# Altium footprint library IC.PcbLib: 44 footprints (part 2 of 3)
Each footprint in its own frame and in the unit in brackets; x right, y up, seen from the top. Pads: shape width x height; smd on the part's side, far side on the other; paste and mask are expansions set on the pad; w line width, h text height; cw(c..) or ccw(c..) is an arc to the next point about the centre after c.
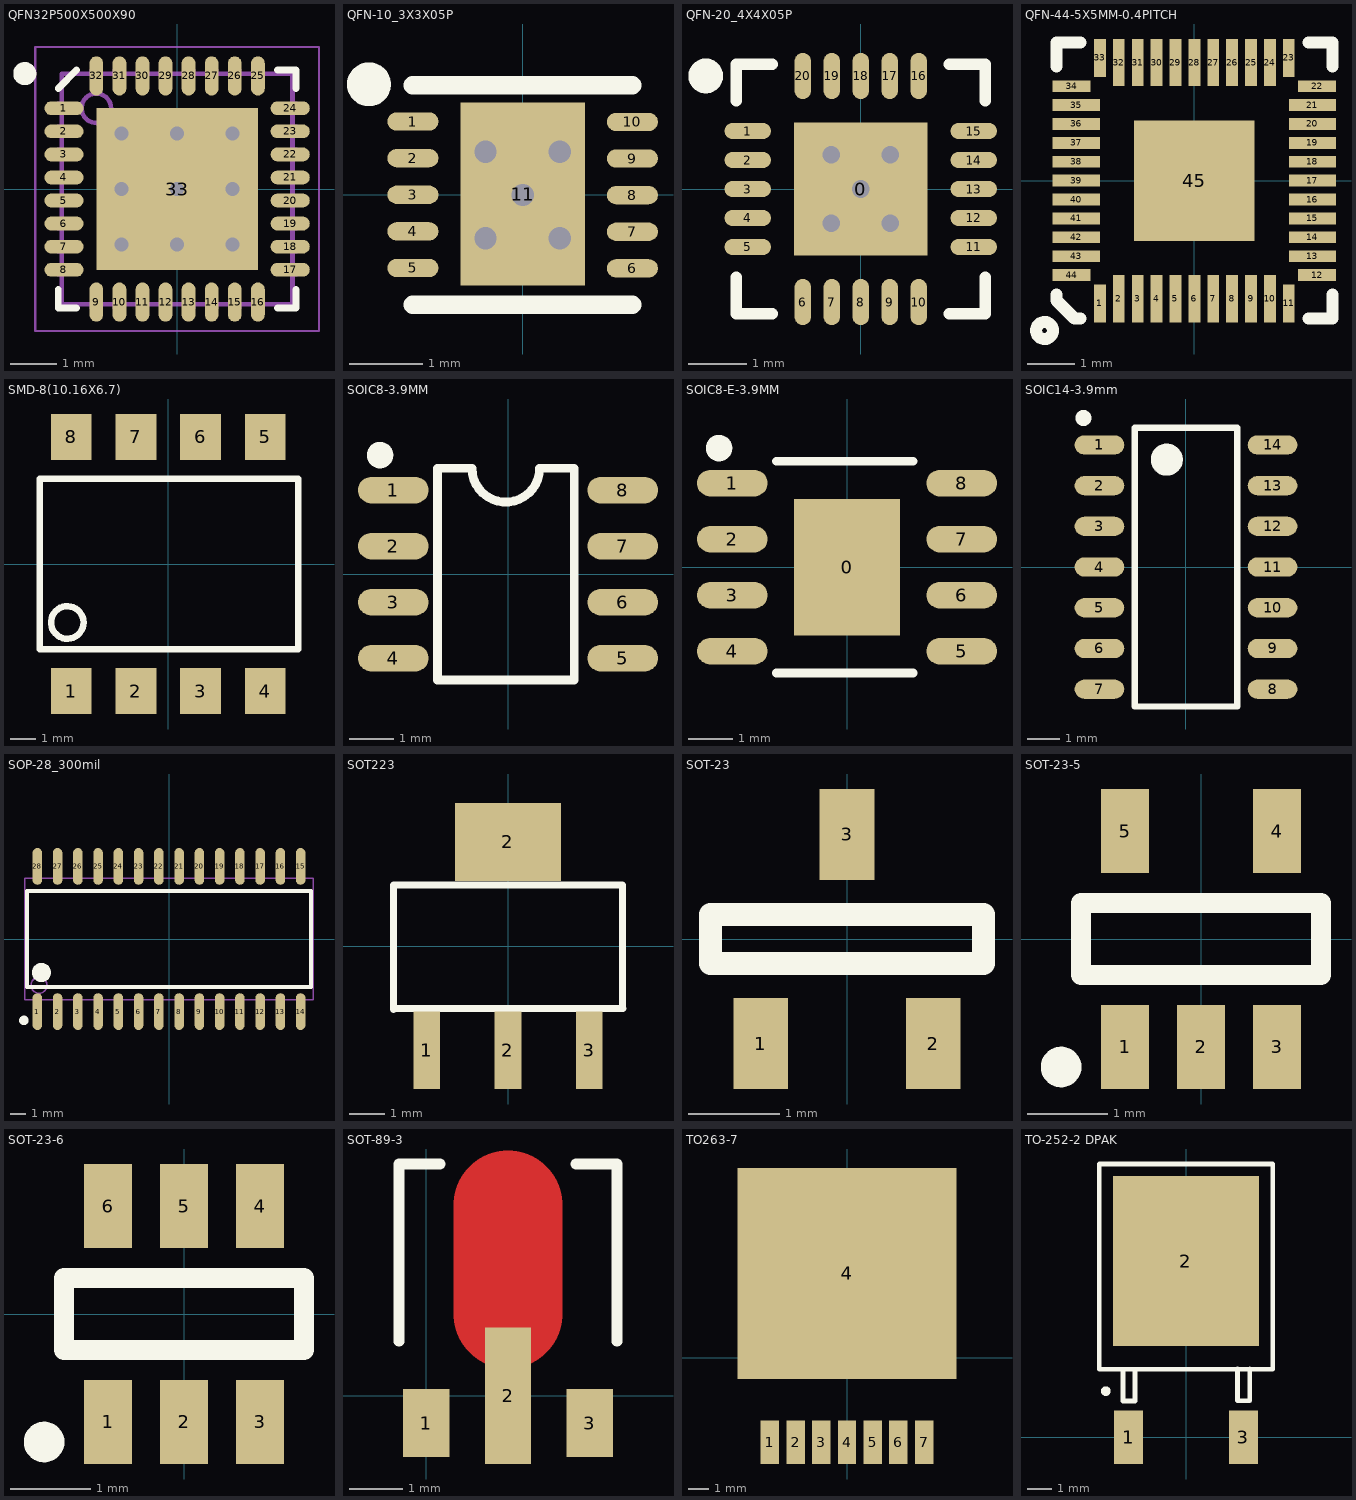
[diagram p1: the footprints below, top view; thin cyan lines are the x and y axes]

## QFN32P500X500X90 [mm] "nrf52810qcaa"
pads (33):
  oval 0.85x0.3 smd mask+0.076: 1(-2.45,1.75) 2(-2.45,1.25) 3(-2.45,0.75) 4(-2.45,0.25) 5(-2.45,-0.25) 6(-2.45,-0.75) 7(-2.45,-1.25) 8(-2.45,-1.75) 17(2.45,-1.75) 18(2.45,-1.25) 19(2.45,-0.75) 20(2.45,-0.25) 21(2.45,0.25) 22(2.45,0.75) 23(2.45,1.25) 24(2.45,1.75)
  oval 0.3x0.85 smd mask+0.076: 9(-1.75,-2.45) 10(-1.25,-2.45) 11(-0.75,-2.45) 12(-0.25,-2.45) 13(0.25,-2.45) 14(0.75,-2.45) 15(1.25,-2.45) 16(1.75,-2.45) 25(1.75,2.45) 26(1.25,2.45) 27(0.75,2.45) 28(0.25,2.45) 29(-0.25,2.45) 30(-0.75,2.45) 31(-1.25,2.45) 32(-1.75,2.45)
  rect 3.5x3.5 smd: 33(0,0)
via 0,0 diameter 0.61 hole 0.305
via 0,1.2 diameter 0.61 hole 0.305
via -1.2,1.2 diameter 0.61 hole 0.305
via -1.2,0 diameter 0.61 hole 0.305
via -1.2,-1.2 diameter 0.61 hole 0.305
via 0,-1.2 diameter 0.61 hole 0.305
via 1.2,-1.2 diameter 0.61 hole 0.305
via 1.2,0 diameter 0.61 hole 0.305
via 1.2,1.2 diameter 0.61 hole 0.305
Top Overlay:
  circle w0.25: c-3.3,2.5 r0.125
  lines w0.15: -2.575,-2.175 -2.575,-2.575 -2.175,-2.575 ; -2.575,2.175 -2.175,2.575 ; 2.175,-2.575 2.575,-2.575 2.575,-2.175 ; 2.175,2.575 2.575,2.575 2.575,2.175
Mechanical 7:
  circle w0.1: c-1.75,1.75 r0.32
  lines w0.1: -2.5,-1.845 -2.571,-1.845 cw(c-2.571,-1.75) -2.571,-1.655 -2.5,-1.655 ; -2.5,-1.345 -2.571,-1.345 cw(c-2.571,-1.25) -2.571,-1.155 -2.5,-1.155 ; -2.5,-0.845 -2.571,-0.845 cw(c-2.571,-0.75) -2.571,-0.655 -2.5,-0.655 ; -2.5,-0.345 -2.571,-0.345 cw(c-2.571,-0.25) -2.571,-0.155 -2.5,-0.155 ; -2.5,0.155 -2.571,0.155 cw(c-2.571,0.25) -2.571,0.345 -2.5,0.345 ; -2.5,0.655 -2.571,0.655 cw(c-2.571,0.75) -2.571,0.845 -2.5,0.845 ; -2.5,1.155 -2.571,1.155 cw(c-2.571,1.25) -2.571,1.345 -2.5,1.345 ; -2.5,1.655 -2.571,1.655 cw(c-2.571,1.75) -2.571,1.845 -2.5,1.845 ; -1.845,-2.5 -1.845,-2.571 ccw(c-1.75,-2.571) -1.655,-2.571 -1.655,-2.5 ; -1.845,2.5 -1.845,2.571 cw(c-1.75,2.571) -1.655,2.571 -1.655,2.5 ; -1.345,-2.5 -1.345,-2.571 ccw(c-1.25,-2.571) -1.155,-2.571 -1.155,-2.5 ; -1.345,2.5 -1.345,2.571 cw(c-1.25,2.571) -1.155,2.571 -1.155,2.5 ; -0.845,-2.5 -0.845,-2.571 ccw(c-0.75,-2.571) -0.655,-2.571 -0.655,-2.5 ; -0.845,2.5 -0.845,2.571 cw(c-0.75,2.571) -0.655,2.571 -0.655,2.5 ; -0.345,-2.5 -0.345,-2.571 ccw(c-0.25,-2.571) -0.155,-2.571 -0.155,-2.5 ; -0.345,2.5 -0.345,2.571 cw(c-0.25,2.571) -0.155,2.571 -0.155,2.5 ; 0.155,-2.5 0.155,-2.571 ccw(c0.25,-2.571) 0.345,-2.571 0.345,-2.5 ; 0.155,2.5 0.155,2.571 cw(c0.25,2.571) 0.345,2.571 0.345,2.5 ; 0.655,-2.5 0.655,-2.571 ccw(c0.75,-2.571) 0.845,-2.571 0.845,-2.5 ; 0.655,2.5 0.655,2.571 cw(c0.75,2.571) 0.845,2.571 0.845,2.5 ; 1.155,-2.5 1.155,-2.571 ccw(c1.25,-2.571) 1.345,-2.571 1.345,-2.5 ; 1.155,2.5 1.155,2.571 cw(c1.25,2.571) 1.345,2.571 1.345,2.5 ; 1.655,-2.5 1.655,-2.571 ccw(c1.75,-2.571) 1.845,-2.571 1.845,-2.5 ; 1.655,2.5 1.655,2.571 cw(c1.75,2.571) 1.845,2.571 1.845,2.5 ; 2.5,-1.845 2.571,-1.845 ccw(c2.571,-1.75) 2.571,-1.655 2.5,-1.655 ; 2.5,-1.345 2.571,-1.345 ccw(c2.571,-1.25) 2.571,-1.155 2.5,-1.155 ; 2.5,-0.845 2.571,-0.845 ccw(c2.571,-0.75) 2.571,-0.655 2.5,-0.655 ; 2.5,-0.345 2.571,-0.345 ccw(c2.571,-0.25) 2.571,-0.155 2.5,-0.155 ; 2.5,0.155 2.571,0.155 ccw(c2.571,0.25) 2.571,0.345 2.5,0.345 ; 2.5,0.655 2.571,0.655 ccw(c2.571,0.75) 2.571,0.845 2.5,0.845 ; 2.5,1.155 2.571,1.155 ccw(c2.571,1.25) 2.571,1.345 2.5,1.345 ; 2.5,1.655 2.571,1.655 ccw(c2.571,1.75) 2.571,1.845 2.5,1.845 ; -2.5,-2.5 -2.5,2.5 2.5,2.5 2.5,-2.5 -2.5,-2.5
Mechanical 15:
  lines w0.05: -3.075,-3.075 3.075,-3.075 3.075,3.075 -3.075,3.075 -3.075,-3.075
  lines w0.1: -0.5,0 0.5,0 ; 0,-0.5 0,0.5
3D body "QFN50P500X500X90_HS-33N.step": height 0.9, standoff 0, extent -2.501,-2.501 2.501,2.501

## QFN-10_3X3X05P [mm]
pads (11):
  oval 0.7x0.25 smd: 1(-1.5,1.003) 2(-1.5,0.503) 3(-1.5,0.003) 4(-1.5,-0.498) 5(-1.5,-0.998) 6(1.5,-1.003) 7(1.5,-0.503) 8(1.5,-0.003) 9(1.5,0.498) 10(1.5,0.998)
  rect 1.7x2.5 smd: 11(0,0.013)
via 0.508,0.59 diameter 0.61 hole 0.305
via 0.508,-0.59 diameter 0.61 hole 0.305
via 0,0 diameter 0.61 hole 0.305
via -0.508,-0.59 diameter 0.61 hole 0.305
via -0.508,0.59 diameter 0.61 hole 0.305
Top Overlay:
  lines w0.254: -1.5,-1.5 1.5,-1.5 ; -1.5,1.5 1.5,1.5
  lines w0.3: -1.951,1.511 cw(c-2.101,1.513) -1.951,1.514

## QFN-20_4X4X05P [mm]
pads (21):
  rect 2.3x2.3 smd: 0(0,0)
  oval 0.8x0.28 smd: 1(-1.95,1) 2(-1.95,0.5) 3(-1.95,0) 4(-1.95,-0.5) 5(-1.95,-1) 11(1.95,-1) 12(1.95,-0.5) 13(1.95,0) 14(1.95,0.5) 15(1.95,1)
  oval 0.28x0.8 smd: 6(-1,-1.95) 7(-0.5,-1.95) 8(0,-1.95) 9(0.5,-1.95) 10(1,-1.95) 16(1,1.95) 17(0.5,1.95) 18(0,1.95) 19(-0.5,1.95) 20(-1,1.95)
via 0.508,0.59 diameter 0.61 hole 0.305
via 0.508,-0.59 diameter 0.61 hole 0.305
via 0,0 diameter 0.61 hole 0.305
via -0.508,-0.59 diameter 0.61 hole 0.305
via -0.508,0.59 diameter 0.61 hole 0.305
Top Overlay:
  lines w0.2: -2.15,-1.525 -2.15,-2.15 -1.525,-2.15 ; -2.15,1.525 -2.15,2.15 -1.525,2.15 ; 1.525,-2.15 2.15,-2.15 2.15,-1.525 ; 1.525,2.15 2.15,2.15 2.15,1.525
  lines w0.3: -2.525,1.948 cw(c-2.675,1.949) -2.525,1.951

## QFN-44-5X5MM-0.4PITCH [mm]
pads (45):
  rect 0.25x0.8 smd: 1(-2,-2.6) 11(2,-2.6) 23(2,2.6) 33(-2,2.6)
  rect 0.25x1 smd: 2(-1.6,-2.5) 3(-1.2,-2.5) 4(-0.8,-2.5) 5(-0.4,-2.5) 6(0,-2.5) 7(0.4,-2.5) 8(0.8,-2.5) 9(1.2,-2.5) 10(1.6,-2.5) 24(1.6,2.5) 25(1.2,2.5) 26(0.8,2.5) 27(0.4,2.5) 28(0,2.5) 29(-0.4,2.5) 30(-0.8,2.5) 31(-1.2,2.5) 32(-1.6,2.5)
  rect 0.8x0.25 smd: 12(2.6,-2) 22(2.6,2) 34(-2.6,2) 44(-2.6,-2)
  rect 1x0.25 smd: 13(2.5,-1.6) 14(2.5,-1.2) 15(2.5,-0.8) 16(2.5,-0.4) 17(2.5,0) 18(2.5,0.4) 19(2.5,0.8) 20(2.5,1.2) 21(2.5,1.6) 35(-2.5,1.6) 36(-2.5,1.2) 37(-2.5,0.8) 38(-2.5,0.4) 39(-2.5,0) 40(-2.5,-0.4) 41(-2.5,-0.8) 42(-2.5,-1.2) 43(-2.5,-1.6)
  rect 2.55x2.55 smd: 45(0,0)
Top Overlay:
  circle w0.254: c-3.175,-3.175 r0.18
  lines w0.254: -2.921,-2.413 -2.921,-2.54 -2.54,-2.921 -2.413,-2.921 ; -2.921,2.413 -2.921,2.921 -2.413,2.921 ; 2.413,-2.921 2.921,-2.921 2.921,-2.413 ; 2.413,2.921 2.921,2.921 2.921,2.413

## SMD-8(10.16X6.7) [mm]
pads (8):
  rect 1.6x1.8 smd: 1(-3.81,-5) 2(-1.27,-5) 3(1.27,-5) 4(3.81,-5) 5(3.81,5) 6(1.27,5) 7(-1.27,5) 8(-3.81,5)
Top Overlay:
  circle w0.254: c-3.97,-2.3 r0.64
  lines w0.254: -5.05,-3.35 5.11,-3.35 5.11,3.35 -5.05,3.35 -5.05,-3.35

## SOIC8-3.9MM [mm]
pads (8):
  oval 1.6x0.6 smd: 1(-2.6,1.905) 2(-2.6,0.635) 3(-2.6,-0.635) 4(-2.6,-1.905) 5(2.6,-1.905) 6(2.6,-0.635) 7(2.6,0.635) 8(2.6,1.905)
Top Overlay:
  circle w0.3: c-2.9,2.7 r0.15
  lines w0.2: -1.6,-2.4 -1.6,2.4 -0.817,2.4 ccw(c-0.05,2.4) 0.717,2.4 1.5,2.4 1.5,-2.4 -1.6,-2.4
3D body "User Library-SOIC-8 - TEK.step": height 1.6, standoff -0.15, extent -3,-2.5 3,2.5

## SOIC8-E-3.9MM [mm]
pads (9):
  rect 2.4x3.1 smd: 0(0,0)
  oval 1.6x0.6 smd: 1(-2.6,1.905) 2(-2.6,0.635) 3(-2.6,-0.635) 4(-2.6,-1.905) 5(2.6,-1.905) 6(2.6,-0.635) 7(2.6,0.635) 8(2.6,1.905)
Top Overlay:
  circle w0.3: c-2.9,2.7 r0.15
  lines w0.2: -1.6,-2.4 1.5,-2.4 ; -1.6,2.4 1.5,2.4
3D body "User Library-SOIC-8 - TEK.step": height 1.6, standoff -0.15, extent -3,-2.5 3,2.5

## SOIC14-3.9mm [mm] "SOIC14 39mm"
pads (14):
  oval 1.55x0.6 smd: 1(-2.7,3.81) 2(-2.7,2.54) 3(-2.7,1.27) 4(-2.7,0) 5(-2.7,-1.27) 6(-2.7,-2.54) 7(-2.7,-3.81) 8(2.7,-3.81) 9(2.7,-2.54) 10(2.7,-1.27) 11(2.7,0) 12(2.7,1.27) 13(2.7,2.54) 14(2.7,3.81)
Top Overlay:
  circle w0.5: c-0.6,3.35 r0.25
  circle w0.25: c-3.2,4.65 r0.125
  lines w0.2: -1.6,-4.35 1.6,-4.35 1.6,4.35 -1.6,4.35 -1.6,-4.35
3D body "User Library-SOIC-14.step": height 1.75, standoff 0, extent -3,-4.375 3,4.375

## SOP-28_300mil [mm]
pads (28):
  oval 0.6x2.3 smd: 1(-8.255,-4.55) 2(-6.985,-4.55) 3(-5.715,-4.55) 4(-4.445,-4.55) 5(-3.175,-4.55) 6(-1.905,-4.55) 7(-0.635,-4.55) 8(0.635,-4.55) 9(1.905,-4.55) 10(3.175,-4.55) 11(4.445,-4.55) 12(5.715,-4.55) 13(6.985,-4.55) 14(8.255,-4.55) 15(8.255,4.55) 16(6.985,4.55) 17(5.715,4.55) 18(4.445,4.55) 19(3.175,4.55) 20(1.905,4.55) 21(0.635,4.55) 22(-0.635,4.55) 23(-1.905,4.55) 24(-3.175,4.55) 25(-4.445,4.55) 26(-5.715,4.55) 27(-6.985,4.55) 28(-8.255,4.55)
Top Overlay:
  circle w0.6: c-8,-2.1 r0.3
  circle w0.3: c-9.1,-5.1 r0.15
  lines w0.254: -8.9,-3 8.9,-3 8.9,3 -8.9,3 -8.9,-3
Mechanical 13:
  circle w0.1: c-8.15,-2.9 r0.5
  lines w0.1: -9.05,-3.8 9.05,-3.8 9.05,3.8 -9.05,3.8 -9.05,-3.8
3D body: height 2.5, standoff 0.3, extent -9.05,-3.8 9.05,3.8

## SOT223 [mm]
height 50
pads (4):
  rect 0.76x2.2 smd: 1(-2.3,-2.95) 2(0,-2.95) 3(2.3,-2.95)
  rect 3x2.2 smd: 2(0,2.95)
Top Overlay:
  lines w0.2: -3.25,-1.795 -3.23,-1.775 ; 3.25,-1.765 3.26,-1.775 ; -3.25,-1.775 3.25,-1.775 3.25,1.725 -3.25,1.725 -3.25,-1.775
3D body "User Library-SOT-223-1.step": height 1.69, standoff 0.04, extent -3.25,-3.5 3.25,3.5

## SOT-23 [mm] "SOT-23-3"
height 1.1
pads (3):
  rect 0.6x1 smd: 1(-0.95,-1.15) 2(0.95,-1.15) 3(0,1.15)
Top Overlay:
  lines w0.254: -1.5,-0.27 -1.5,0.27 1.5,0.27 1.5,-0.27 -1.5,-0.27
3D body "SOT-23-3.STEP": height 0.99, standoff 0.01, extent -1.46,-1.275 1.46,1.273

## SOT-23-5 [mm] "SOT-23-5"
height 1.2
pads (5):
  rect 0.6x1.05 smd: 1(-0.95,-1.35) 2(0,-1.35) 3(0.95,-1.35) 4(0.95,1.35) 5(-0.95,1.35)
Top Overlay:
  circle w0.254: c-1.75,-1.6 r0.127
  lines w0.254: -1.5,-0.45 1.5,-0.45 1.5,0.45 -1.5,0.45 -1.5,-0.45
3D body "SOT-23-5.STEP": height 1.3, standoff 0, extent -1.5,-1.5 1.5,1.5

## SOT-23-6 [mm] "SOT-23-6"
height 1.2
pads (6):
  rect 0.6x1.05 smd: 1(-0.95,-1.35) 2(0,-1.35) 3(0.95,-1.35) 4(0.95,1.35) 5(0,1.35) 6(-0.95,1.35)
Top Overlay:
  circle w0.254: c-1.75,-1.6 r0.127
  lines w0.254: -1.5,-0.45 1.5,-0.45 1.5,0.45 -1.5,0.45 -1.5,-0.45
3D body "SOT-23-6.STEP": height 1.3, standoff 0, extent -1.5,-1.5 1.5,1.5

## SOT-89-3 [mil]
pads (3):
  rect 34x50 smd: 1(0,-20) 3(120,-20)
  rect 34x100 smd: 2(60,0)
Top Layer:
  lines w80: 60,60 60,140
Top Overlay:
  lines w8: -20,40 -20,170 10,170 ; 110,170 140,170 140,40
Top Solder:
  lines w80: 60,60 60,140
3D body "User Library-SOT-89-2.STEP": height 55.12, standoff 0, extent -30,-30 147.17,124.92

## TO263-7 [mil]
pads (8):
  rect 35.8x85 smd: 1(-150,-164) 2(-100,-164) 3(-50,-164) 4(0,-164) 5(50,-164) 6(100,-164) 7(150,-164)
  rect 425.2x409.8 smd: 4(0,164)
Top Overlay:
  lines w10: -198,-27 198,-27 ; -198,314 198,314
Mechanical 15:
  lines w10: -198,314 -198,-27 198,-27 198,314

## TO-252-2 DPAK [mm]
pads (3):
  rect 1.2x2.2 smd: 1(-2.361,0) 3(2.361,0.004)
  rect 6x7 smd: 2(0,7.25)
Top Overlay:
  circle w0.2: c-3.3,1.9 r0.1
  lines w0.2: -2.6,2.8 -2.6,1.5 -2.1,1.5 -2.1,2.8 ; 2.123,2.804 2.123,1.504 2.623,1.504 2.623,2.804 ; -3.573,2.8 3.573,2.8 3.573,11.25 -3.573,11.25 -3.573,2.8
3D body "TO-252.STEP": height 2.44, standoff 0.03, extent -3.27,-0.2 3.27,9.738